# Altium footprint library Mine.PcbLib: 306 footprints (part 11 of 20)
Each footprint in its own frame and in the unit in brackets; x right, y up, seen from the top. Pads: shape width x height; smd on the part's side, far side on the other; paste and mask are expansions set on the pad; w line width, h text height; cw(c..) or ccw(c..) is an arc to the next point about the centre after c.
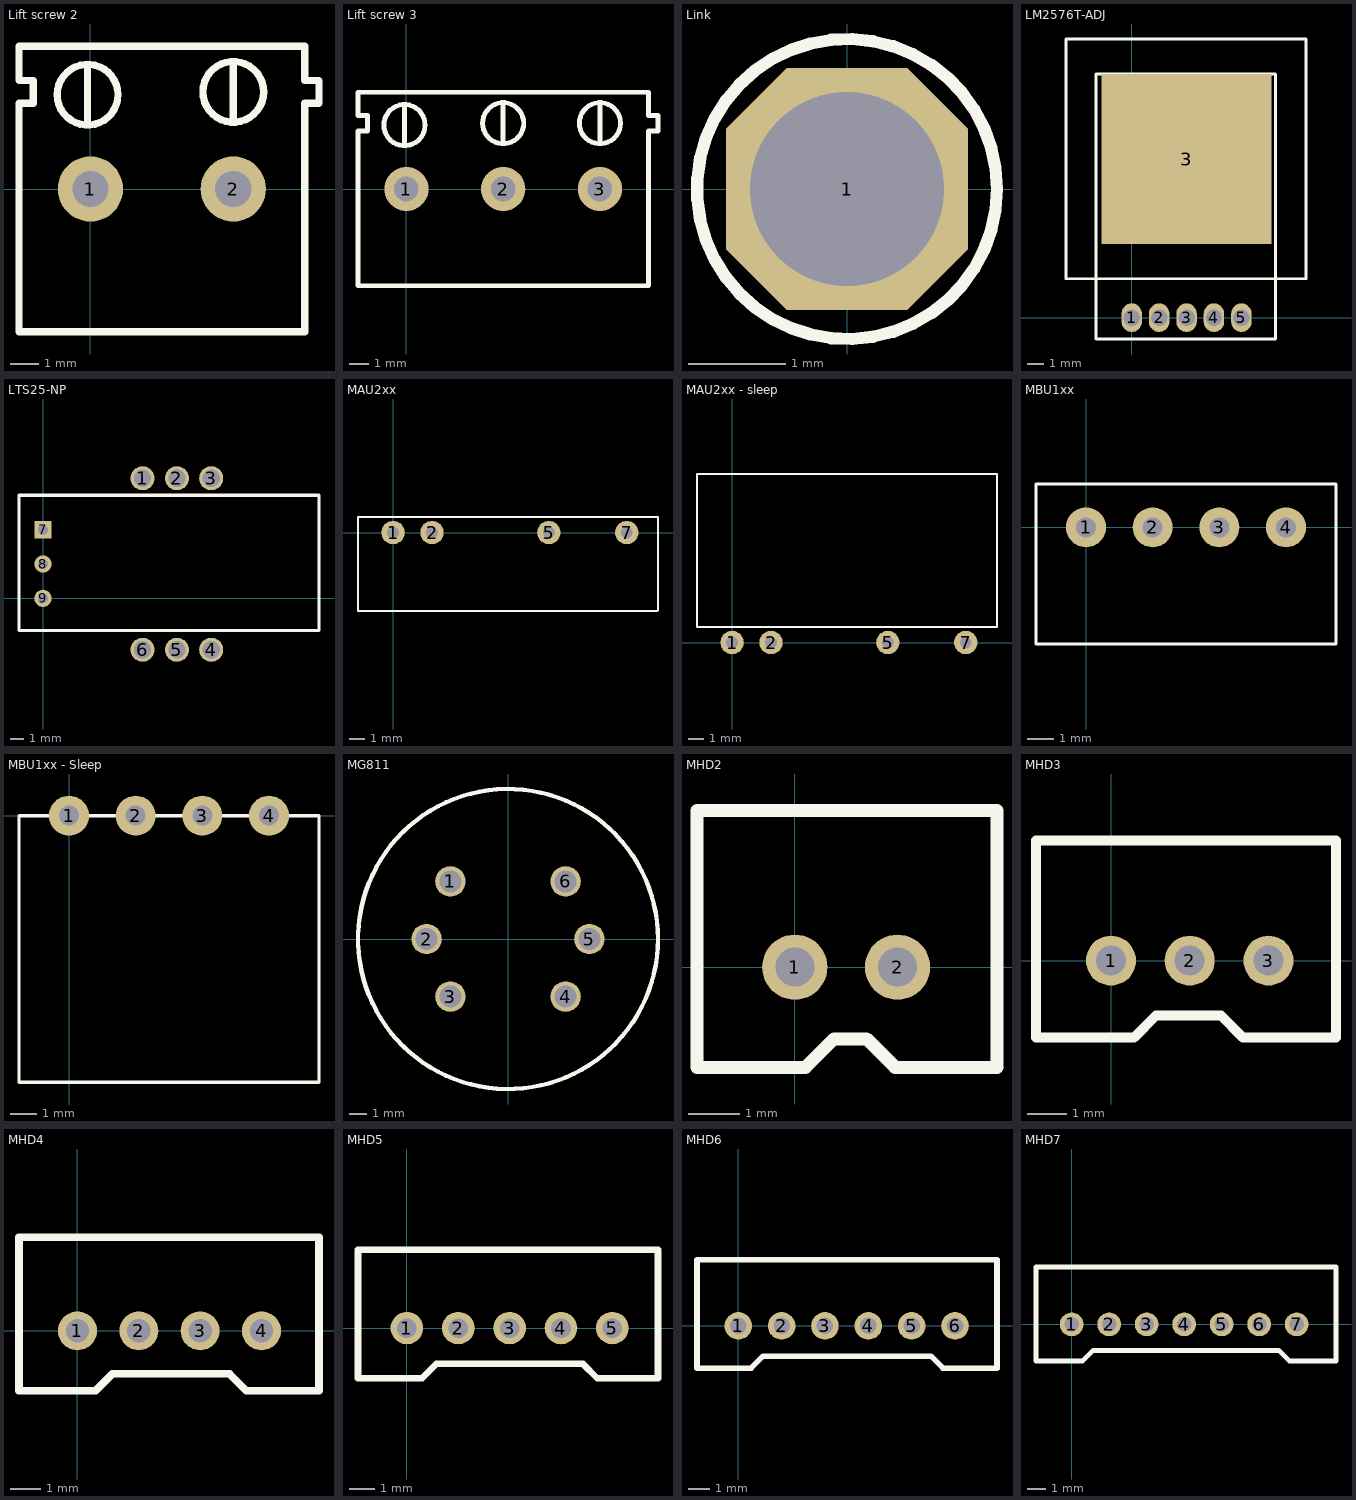
[diagram p10: the footprints below, top view; thin cyan lines are the x and y axes]

## Lift screw 2 [mil]
height 708.66
pads (2):
  round 90 hole 50: 1(0,0) 2(196.85,0)
Top Overlay:
  circle w10: c-3.94,129.92 r41.85
  circle w10: c196.85,133.86 r41.85
  lines w10: -3.94,90.55 -3.94,169.29 ; 196.85,94.49 196.85,173.23 ; -98.43,-196.85 295.28,-196.85 295.28,118.11 314.96,118.11 314.96,149.61 295.28,149.61 295.28,196.85 -98.43,196.85 -98.43,149.61 -78.74,149.61 -78.74,118.11 -98.43,118.11 -98.43,-196.85
3D body: height 549.08, standoff -132.03, extent -98.85,-212 294.85,181.7

## Lift screw 3 [mil]
height 708.66
pads (3):
  round 90 hole 50: 1(0,0) 2(196.85,0) 3(393.7,0)
Top Overlay:
  circle w10: c-3.94,129.92 r41.85
  circle w10: c196.85,133.86 r41.85
  circle w10: c393.7,133.86 r41.85
  lines w10: -3.94,90.55 -3.94,169.29 ; 196.85,94.49 196.85,173.23 ; 393.7,94.49 393.7,173.23 ; -98.43,-196.85 492.13,-196.85 492.13,118.11 511.81,118.11 511.81,149.61 492.13,149.61 492.13,196.85 -98.43,196.85 -98.43,149.61 -78.74,149.61 -78.74,118.11 -98.43,118.11 -98.43,-196.85
3D body: height 395.47, standoff -88.14, extent -117,-150 493.24,153.15

## Link [mm]
pads (1):
  oct 2.5x2.5 hole 2: 1(0,0)
Top Overlay:
  circle w0.127: c0,0 r1.55
Bottom Overlay:
  circle w0.127: c0,0 r1.55

## LM2576T-ADJ [mil]
height 236.22
pads (6):
  oval 50x70 hole 40: 1(0,0) 2(66.93,0) 3(133.86,0) 4(200.79,0) 5(267.72,0)
  rect 414.96x414.96 smd: 3(133.86,387.01)
Top Overlay:
  lines w7: -160,95 425,95 425,680 -160,680 -160,95 ; -87,-52 351,-52 351,595 -87,595 -87,-52

## LTS25-NP [mil] "Current Sense"
height 944.88
pads (9):
  round 70 hole 50: 1(290,350) 2(390,350) 3(490,350) 4(490,-150) 5(390,-150) 6(290,-150)
  rect 50x50 hole 30: 7(0,200)
  round 50 hole 30: 8(0,100) 9(0,0)
Top Overlay:
  lines w10: -70,-93.7 804.02,-93.7 804.02,300 -70,300 -70,-93.7

## MAU2xx [mil] "Minimax isolated regulator"
height 393.7
pads (4):
  round 60 hole 30: 1(0,0) 2(100,0) 5(400,0) 7(600,0)
Top Overlay:
  lines w5: -90,-200.79 679.21,-200.79 680,-200 680,39.37 -90,39.37 -90,-200.79

## MAU2xx - sleep [mil] "Minimax isolated regulator"
height 240.16
pads (4):
  round 60 hole 30: 1(0,0) 2(100,0) 5(400,0) 7(600,0)
Top Overlay:
  lines w5: -90,39.37 680,39.37 680,433.07 -90,433.07 -90,39.37

## MBU1xx [mil] "Minimax isolated regulator"
height 401.57
pads (4):
  round 60 hole 30: 1(0,0) 2(100,0) 3(200,0) 4(300,0)
Top Overlay:
  lines w5: -75,-175 375,-175 375,65 -75,65 -75,-175

## MBU1xx - Sleep [mil] "Minimax isolated regulator"
height 240
pads (4):
  round 60 hole 30: 1(0,0) 2(100,0) 3(200,0) 4(300,0)
Top Overlay:
  lines w5: -75,-400 -75,0 375,0 375,-400 -75,-400

## MG811 [mil] "CO2 as sensor"
height 629.92
pads (6):
  round 70 hole 50: 1(-132.24,132.24) 2(-187.01,0) 3(-132.24,-132.24) 4(132.24,-132.24) 5(187.01,0) 6(132.24,132.24)
Top Overlay:
  circle w10: c0,0 r344.49

## MHD2 [mil] "Miniature"
height 236.22
pads (2):
  round 50 hole 30: 1(0,0) 2(78.74,0)
Top Overlay:
  lines w10: -75,-76.85 8.15,-76.85 30,-55 55,-55 76.85,-76.85 155,-76.85 155,120 -75,120 -75,-76.85

## MHD3 [mil] "Miniature"
height 236.22
pads (3):
  round 50 hole 30: 1(0,0) 2(78.74,0) 3(157.48,0)
Top Overlay:
  lines w10: -75,-76.85 23.15,-76.85 45,-55 110,-55 131.85,-76.85 225,-76.85 225,120 -75,120 -75,-76.85

## MHD4 [mil] "Miniature"
height 236.22
pads (4):
  round 50 hole 30: 1(0,0) 2(78.74,0) 3(157.48,0) 4(236.22,0)
Top Overlay:
  lines w10: -75,-76.85 23.15,-76.85 45,-55 195,-55 216.85,-76.85 310,-76.85 310,120 -75,120 -75,-76.85

## MHD5 [mil] "Miniature"
height 236.22
pads (5):
  round 50 hole 30: 1(0,0) 2(78.74,0) 3(157.48,0) 4(236.22,0) 5(314.96,0)
Top Overlay:
  lines w10: -75,-76.85 -75,120 385,120 385,-76.85 291.85,-76.85 270,-55 45,-55 23.15,-76.85 -75,-76.85

## MHD6 [mil] "Miniature"
height 236.22
pads (6):
  round 50 hole 30: 1(0,0) 2(78.74,0) 3(157.48,0) 4(236.22,0) 5(314.96,0) 6(393.7,0)
Top Overlay:
  lines w10: -75,-76.85 -75,120 470,120 470,-76.85 371.85,-76.85 350,-55 45,-55 23.15,-76.85 -75,-76.85

## MHD7 [mil] "Miniature"
height 236.22
pads (7):
  round 50 hole 30: 1(0,0) 2(78.74,0) 3(157.48,0) 4(236.22,0) 5(314.96,0) 6(393.7,0) 7(472.44,0)
Top Overlay:
  lines w10: -75,-76.85 -75,120 555,120 555,-76.85 456.85,-76.85 435,-55 45,-55 23.15,-76.85 -75,-76.85